# Altium footprint library 我的封装库.PcbLib: 90 footprints (part 5 of 6)
Each footprint in its own frame and in the unit in brackets; x right, y up, seen from the top. Pads: shape width x height; smd on the part's side, far side on the other; paste and mask are expansions set on the pad; w line width, h text height; cw(c..) or ccw(c..) is an arc to the next point about the centre after c.
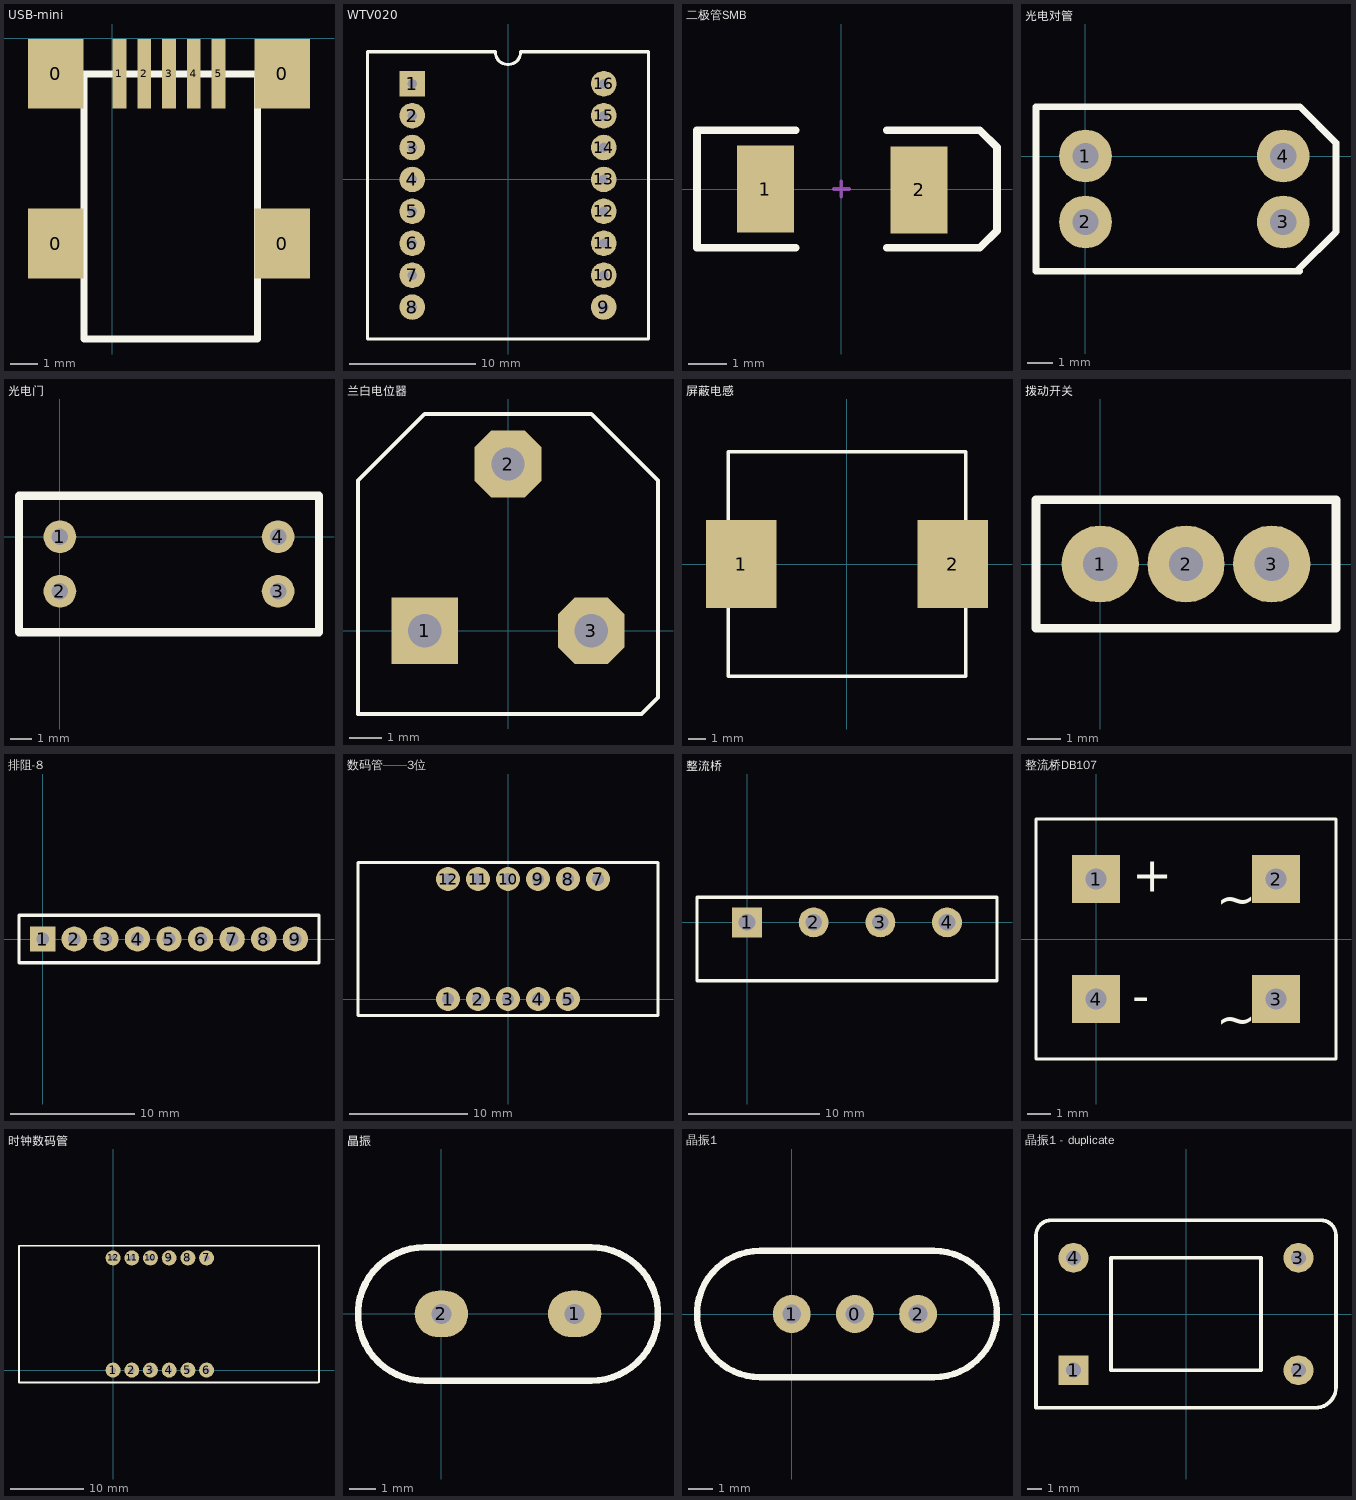
[diagram p4: the footprints below, top view; thin cyan lines are the x and y axes]

## USB-mini [mm]
pads (9):
  rect 2x2.5 smd: 0(-2.032,-7.366) 0(-2.032,-1.27) 0(6.096,-7.366) 0(6.096,-1.27)
  rect 0.5x2.5 smd: 1(0.254,-1.27) 2(1.143,-1.27) 3(2.032,-1.27) 4(2.921,-1.27) 5(3.81,-1.27)
Top Overlay:
  lines w0.254: -1.016,-10.795 -1.016,-1.27 5.207,-1.27 5.207,-10.795 -1.016,-10.795

## WTV020 [mil]
pads (16):
  rect 80x80 hole 30: 1(-300,300)
  round 80 hole 30: 2(-300,200) 3(-300,100) 4(-300,0) 5(-300,-100) 6(-300,-200) 7(-300,-300) 8(-300,-400) 9(300,-400) 10(300,-300) 11(300,-200) 12(300,-100) 13(300,0) 14(300,100) 15(300,200) 16(300,300)
Top Overlay:
  lines w10: -440,-500 440,-500 440,400 40,400 cw(c0,400) -40,400 -440,400 -440,-500

## 二极管SMB [mm]
pads (2):
  rect 1.5x2.3 smd: 1(-2,0) 2(2.05,-0.025)
Top Overlay:
  lines w0.2: -1.2,-1.55 -3.8,-1.55 -3.8,1.55 -1.2,1.55 ; 1.2,-1.55 3.65,-1.55 4.1,-1.1 4.1,1.1 3.65,1.55 1.2,1.55
Mechanical 1:
  lines w0.1: -0.2,0 0.2,0 ; 0,-0.2 0,0.2

## 光电对管 [mil]
pads (4):
  round 80 hole 40: 1(0,0) 2(0,-100) 3(300,-100) 4(300,0)
Top Overlay:
  lines w10: 322.5,-172.5 380,-115 380,20 325,75 -75,75 -75,-175 325,-175

## 光电门 [mil]
pads (4):
  round 60 hole 30: 1(0,0) 2(0,-100) 3(400,-100) 4(400,0)
Top Overlay:
  lines w15: -75,-175 475,-175 475,75 -75,75 -75,-175

## 兰白电位器 [mil]
pads (3):
  rect 80x80 hole 40: 1(-100,0)
  oct 80x80 hole 40: 2(0,200) 3(100,0)
Top Overlay:
  lines w5: -180,-100 160,-100 180,-80 180,180 100,260 -100,260 -180,180 -180,-100

## 屏蔽电感 [mm]
pads (2):
  rect 4x5 smd: 1(-6,0) 2(6,0)
Top Overlay:
  lines w0.2: -6.731,-6.35 6.731,-6.35 6.731,6.35 -6.731,6.35 -6.731,-0.001 -6.731,-6.35

## 拨动开关 [mil]
pads (3):
  round 90 hole 40: 1(0,0) 2(100,0) 3(200,0)
Top Overlay:
  lines w10: -75,-75 275,-75 275,75 -75,75 -75,-75

## 排阻-8 [mil]
pads (9):
  rect 80x80 hole 40: 1(0,0)
  round 80 hole 40: 2(100,0) 3(200,0) 4(300,0) 5(400,0) 6(500,0) 7(600,0) 8(700,0) 9(800,0)
Top Overlay:
  lines w10: -75,-75 875,-75 875,75 -75,75 -75,-75

## 数码管——3位 [mil]
pads (11):
  round 80 hole 40: 1(-200,0) 2(-100,0) 3(0,0) 4(100,0) 5(200,0) 7(300,400) 8(200,400) 9(100,400) 10(0,400) 11(-100,400) 12(-200,400)
Top Overlay:
  lines w10: -500,-55 500,-55 500,455 -500,455 -500,-55

## 整流桥 [mil]
pads (4):
  rect 90x90 hole 50: 1(0,0)
  round 90 hole 50: 2(200,0) 3(400,0) 4(600,0)
Top Overlay:
  lines w10: -150,-175 750,-175 750,75 -150,75 -150,-175

## 整流桥DB107 [mil]
pads (4):
  rect 80x80 hole 35: 1(0,100) 2(300,100) 3(300,-100) 4(0,-100)
Top Overlay:
  lines w5: -100,-200 400,-200 400,200 -100,200 -100,-200
  text "+" at 60,60 h100
  text "-" at 60,-140 h100
  text "~" at 200,20 h100
  text "~" at 200,-180 h100

## 时钟数码管 [mil]
pads (12):
  round 80 hole 30: 1(0,0) 2(100,0) 3(200,0) 4(300,0) 5(400,0) 6(500,0) 7(500,600) 8(400,600) 9(300,600) 10(200,600) 11(100,600) 12(0,600)
Top Overlay:
  lines w10: -502.76,-65 1096.8,-65 ; -502.76,665 1100.74,665 ; -501.99,-64.72 -501.99,665.28 ; 1100.6,-64.58 1100.6,665.42

## 晶振 [mil]
pads (2):
  oval 80x70 hole 30: 1(200,0) 2(0,0)
Top Overlay:
  lines w10: -25,-100.25 cw(c-25,-0.12) -25,100 225,100 cw(c225,-0.12) 225,-100.25 -25,-100.25

## 晶振1 [mil]
pads (3):
  round 60 hole 30: 0(100,0) 1(0,0) 2(200,0)
Top Overlay:
  lines w10: -50,-100 cw(c-50,0) -50,100 225,100 cw(c225,0) 225,-100 -50,-100

## 晶振1 - duplicate [mil]
pads (4):
  rect 80x80 hole 40: 1(-300,-150)
  round 80 hole 40: 2(300,-150) 3(300,150) 4(-300,150)
Top Overlay:
  lines w10: -400,-250 345,-250 ccw(c345,-195) 400,-195 400,210 ccw(c360,210) 360,250 -360,250 ccw(c-360,210) -400,210 -400,-250 ; -200,-150 -200,150 200,150 200,-150 -200,-150